# Altium schematic symbol library Linear Technology PMIC-Switching Reg LTC1174-LTC3901.SchLib: 2647 symbols (part 45 of 195) (continued)
## LTC3458LEDE (continued)

## LTC3458LEDE#PBF
designator U?
1.7 A, 1.5 MHz Synchronous Step-Up DC/DC Converter with Output Disconnect, 12-pin SON (DE-UE-12), -40 to 85 degC, Pb-Free; Manufacturer: Linear Technology; PartNumber: LTC3458LEDE#PBF; Number of Outputs: 1; PackageReference: DE-UE-12; PackageDescription: 12-Pin Plastic DFN, Body 4 x 3 mm, Pitch 0.5 mm; Supplier 1: Digi-Key; Supplier Part Number 1: LTC3458LEDE#PBF-ND; RoHS: TRUE; Code_JEDEC: MO-229
footprint LT-DE-UE-12_V (SON, 12-Leads, Body 4x3mm, Pitch 0.5mm, Thermal Pad 3.3x1.7mm)
pins: 1 SW (power) "Switch Pin for Inductor Connection. During discontinuous conduction mode an antiring resistor connects SW to VIN to reduce noise.", 2 VIN (power) "Input Supply Pin. Connect this to the input supply and decouple with 1uF minimum.", 3 SYNC (in) "Oscillator Synchronization Pin. A clock pulse width of 100ns to 2us is required to synchronize the internal oscillator. This pin is disabled when grounded.", 4 ~{SHDN} (in) "Shutdown Pin. Grounding this pin shuts down the IC. Connect to >1.25V to enable.", 5 ILIM (in) "Adjustable Peak Current Limit. Connect a resistor from ILIM to GND to program the peak inductor current according to the following formula: ILIMIT=180/RILIM where ILIMIT is in amps and RILIM is in kohm.", 6 RT "Connect a resistor to ground to program the oscillator frequency, according to the formula:  Fosc = 1/(0.2+0.004 ?RT) where fOSC is in MHz and RT is in kohm. Oscillator frequency can be programmed between 400kHz and (See Datasheet)", 7 FB (in) "Connect Resistor Divider Tap Here. The output voltage can be adjusted from 2V to 6V. Feedback reference voltage is typically 1.225V.", 8 COMP "gm Error Amp Output. A frequency compensation network is connected from this pin to ground to compensate the loop. See the section “Compensating the Feedback Loop?for guidelines.", 9 GND (power) "Signal Ground Pin.", 10 SS (in) "Connect a capacitor between this pin and ground to set soft-start period. 5uA of current is sourced from SS during soft-start.", 11 BURST (in) "Burst Mode Threshold Adjust Pin. A resistor/capacitor combination from this pin to ground programs the average load current at which automatic Burst Mode operation is entered.", 12 VOUT (power) "Output of the Synchronous Rectifier and Internal Gate Drive Source for the Power Switches.", 13 EP (power) "Must be soldered to PCB ground, for electrical contact and optimum thermal performance."

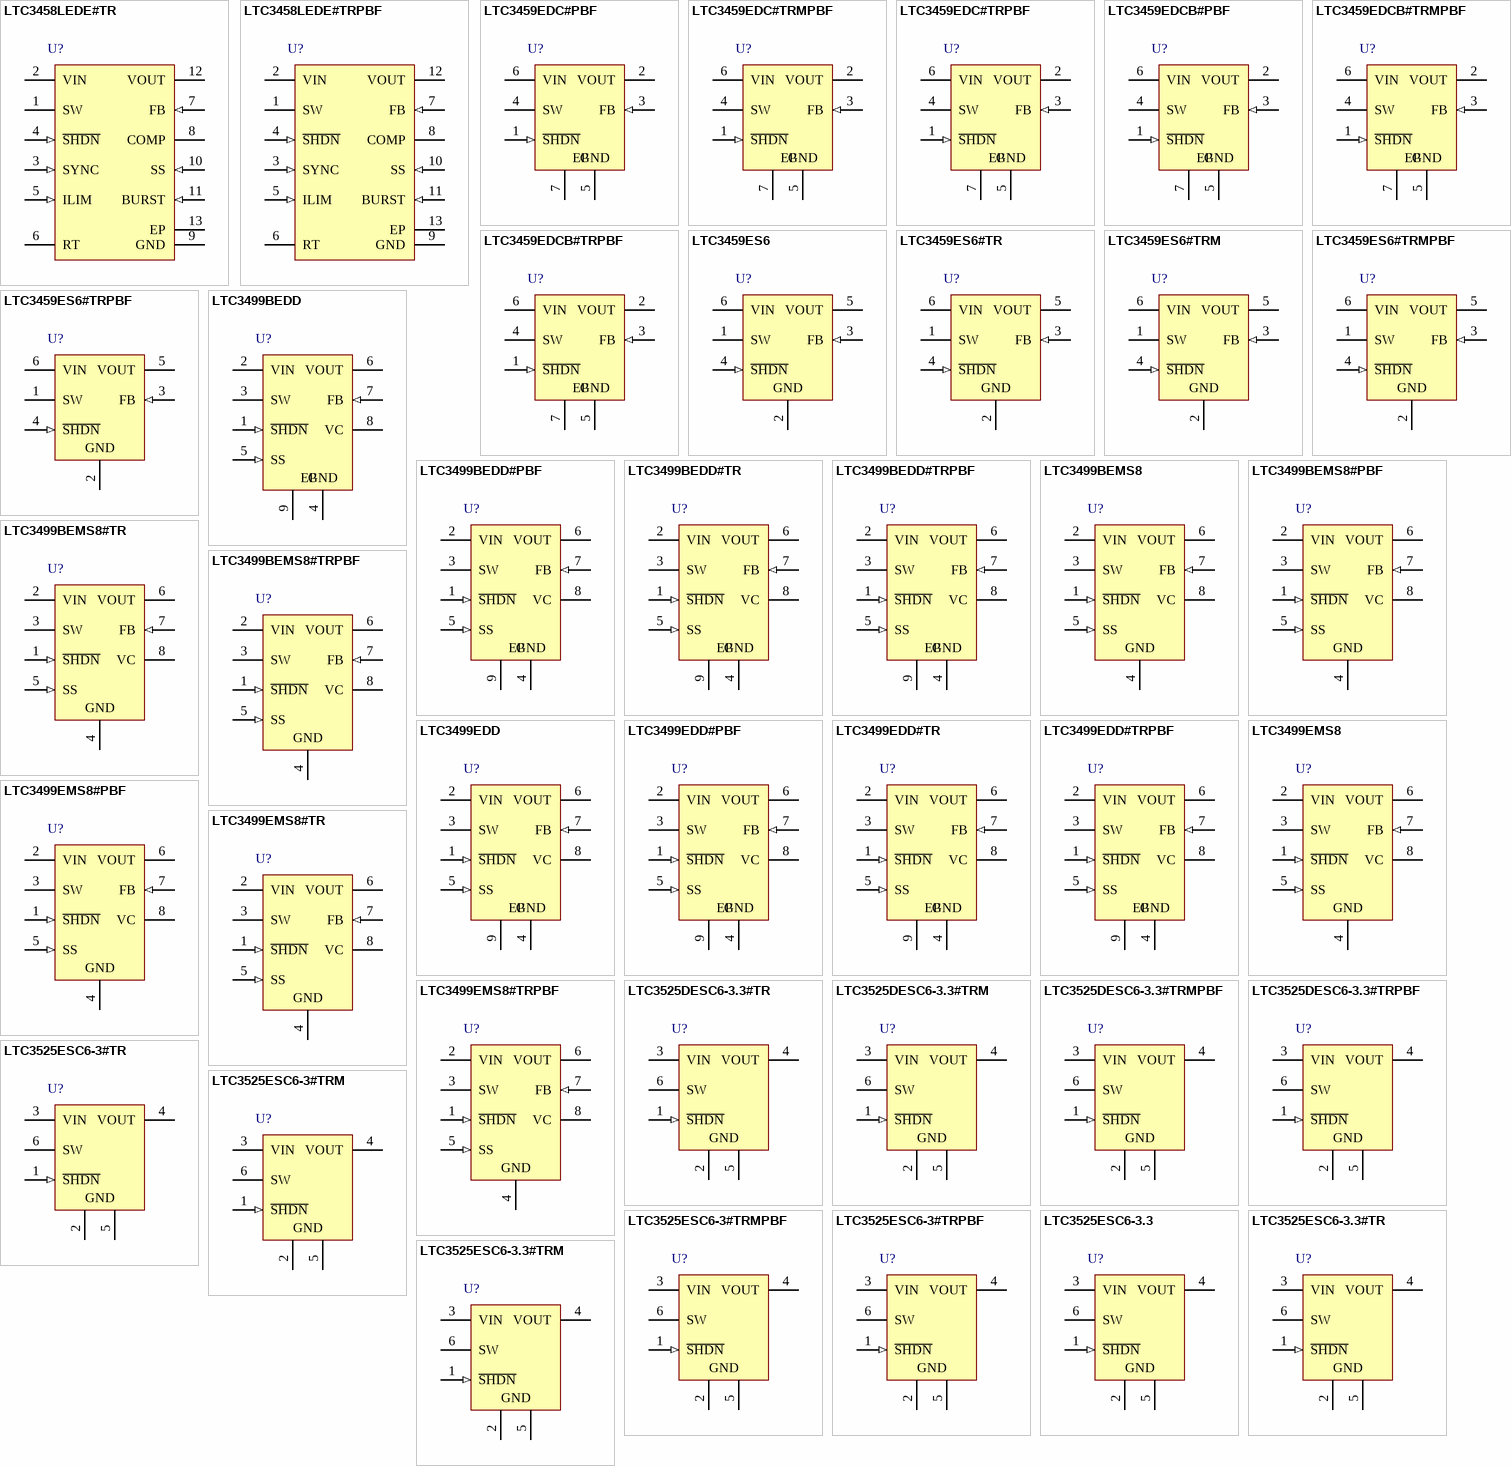
[diagram p28: symbols LTC3458LEDE#TR to LTC3525ESC6-3.3#TRM]

## LTC3458LEDE#TR
designator U?
1.7 A, 1.5 MHz Synchronous Step-Up DC/DC Converter with Output Disconnect, 12-pin SON (DE-UE-12), -40 to 85 degC, Tape and Reel; Manufacturer: Linear Technology; PartNumber: LTC3458LEDE#TR; Number of Outputs: 1; PackageReference: DE-UE-12; PackageDescription: 12-Pin Plastic DFN, Body 4 x 3 mm, Pitch 0.5 mm; RoHS: FALSE; Code_JEDEC: MO-229
footprint LT-DE-UE-12_V (SON, 12-Leads, Body 4x3mm, Pitch 0.5mm, Thermal Pad 3.3x1.7mm)
pins: 1 SW (power) "Switch Pin for Inductor Connection. During discontinuous conduction mode an antiring resistor connects SW to VIN to reduce noise.", 2 VIN (power) "Input Supply Pin. Connect this to the input supply and decouple with 1uF minimum.", 3 SYNC (in) "Oscillator Synchronization Pin. A clock pulse width of 100ns to 2us is required to synchronize the internal oscillator. This pin is disabled when grounded.", 4 ~{SHDN} (in) "Shutdown Pin. Grounding this pin shuts down the IC. Connect to >1.25V to enable.", 5 ILIM (in) "Adjustable Peak Current Limit. Connect a resistor from ILIM to GND to program the peak inductor current according to the following formula: ILIMIT=180/RILIM where ILIMIT is in amps and RILIM is in kohm.", 6 RT "Connect a resistor to ground to program the oscillator frequency, according to the formula:  Fosc = 1/(0.2+0.004 ?RT) where fOSC is in MHz and RT is in kohm. Oscillator frequency can be programmed between 400kHz and (See Datasheet)", 7 FB (in) "Connect Resistor Divider Tap Here. The output voltage can be adjusted from 2V to 6V. Feedback reference voltage is typically 1.225V.", 8 COMP "gm Error Amp Output. A frequency compensation network is connected from this pin to ground to compensate the loop. See the section “Compensating the Feedback Loop?for guidelines.", 9 GND (power) "Signal Ground Pin.", 10 SS (in) "Connect a capacitor between this pin and ground to set soft-start period. 5uA of current is sourced from SS during soft-start.", 11 BURST (in) "Burst Mode Threshold Adjust Pin. A resistor/capacitor combination from this pin to ground programs the average load current at which automatic Burst Mode operation is entered.", 12 VOUT (power) "Output of the Synchronous Rectifier and Internal Gate Drive Source for the Power Switches.", 13 EP (power) "Must be soldered to PCB ground, for electrical contact and optimum thermal performance."

## LTC3458LEDE#TRPBF
designator U?
1.7 A, 1.5 MHz Synchronous Step-Up DC/DC Converter with Output Disconnect, 12-pin SON (DE-UE-12), -40 to 85 degC, Pb-Free, Tape and Reel; Manufacturer: Linear Technology; PartNumber: LTC3458LEDE#TRPBF; Number of Outputs: 1; PackageReference: DE-UE-12; PackageDescription: 12-Pin Plastic DFN, Body 4 x 3 mm, Pitch 0.5 mm; Supplier 1: Digi-Key; Supplier Part Number 1: LTC3458LEDE#TRPBF-ND; RoHS: TRUE; Code_JEDEC: MO-229
footprint LT-DE-UE-12_V (SON, 12-Leads, Body 4x3mm, Pitch 0.5mm, Thermal Pad 3.3x1.7mm)
pins: 1 SW (power) "Switch Pin for Inductor Connection. During discontinuous conduction mode an antiring resistor connects SW to VIN to reduce noise.", 2 VIN (power) "Input Supply Pin. Connect this to the input supply and decouple with 1uF minimum.", 3 SYNC (in) "Oscillator Synchronization Pin. A clock pulse width of 100ns to 2us is required to synchronize the internal oscillator. This pin is disabled when grounded.", 4 ~{SHDN} (in) "Shutdown Pin. Grounding this pin shuts down the IC. Connect to >1.25V to enable.", 5 ILIM (in) "Adjustable Peak Current Limit. Connect a resistor from ILIM to GND to program the peak inductor current according to the following formula: ILIMIT=180/RILIM where ILIMIT is in amps and RILIM is in kohm.", 6 RT "Connect a resistor to ground to program the oscillator frequency, according to the formula:  Fosc = 1/(0.2+0.004 ?RT) where fOSC is in MHz and RT is in kohm. Oscillator frequency can be programmed between 400kHz and (See Datasheet)", 7 FB (in) "Connect Resistor Divider Tap Here. The output voltage can be adjusted from 2V to 6V. Feedback reference voltage is typically 1.225V.", 8 COMP "gm Error Amp Output. A frequency compensation network is connected from this pin to ground to compensate the loop. See the section “Compensating the Feedback Loop?for guidelines.", 9 GND (power) "Signal Ground Pin.", 10 SS (in) "Connect a capacitor between this pin and ground to set soft-start period. 5uA of current is sourced from SS during soft-start.", 11 BURST (in) "Burst Mode Threshold Adjust Pin. A resistor/capacitor combination from this pin to ground programs the average load current at which automatic Burst Mode operation is entered.", 12 VOUT (power) "Output of the Synchronous Rectifier and Internal Gate Drive Source for the Power Switches.", 13 EP (power) "Must be soldered to PCB ground, for electrical contact and optimum thermal performance."

## LTC3459EDC#PBF
designator U?
Micropower Synchronous Boost Converter, 6-pin SON (DC6-6), -40 to 85 degC, Pb-Free; Manufacturer: Linear Technology; PartNumber: LTC3459EDC#PBF; Number of Outputs: 1; PackageReference: DC6-6; PackageDescription: 6-Pin Plastic DFN, Body 2 x 2 mm, Pitch 0.5 mm; Supplier 1: Newark; Supplier Part Number 1: 11R8017; RoHS: TRUE; Code_JEDEC: MO-229
footprint LT-DC6-6_V (SON, 6-Leads, Body 2x2mm, Pitch 0.5mm, Thermal Pad 1.42x0.61mm)
pins: 1 ~{SHDN} (in) "Master Shutdown Input. Driving S\H\D\N\ low disables all IC functions and reduces quiescent current from the battery to less than 1uA. This pin must be pulled above 1V to enable the IC.", 2 VOUT (power) "Regulated Output Voltage of the Boost Regulator. Bypass VOUT with a low ESR, ESL ceramic capacitor between 2.2uF and 10uF. VOUT ripple increases with smaller capacitors.", 3 FB (in) "Input to the Burst Mode Comparator. An external resistor divider connected between VOUT, GND and this pin sets the output voltage to: VOUT = 1.22(1 + R1/R2)", 4 SW "Switch Pin. Connect a 15uH to 33uH inductor between SW and VIN. Keep PCB trace lengths as short and wide as possible to reduce EMI and voltage overshoot. If the inductor current falls to zero, the internal P-channel MOSFET (See Datasheet)", 5 GND (power) "Signal and Power Ground. Provide a short, direct PCB path between GND and the (-) side of the fi lter capacitors on VIN and VOUT.", 6 VIN (power) "Input Supply Pin. Bypass VIN with a low ESR, ESL ceramic capacitor of at least 1uF.", 7 EP (power) "Ground. The Exposed Pad must be soldered to PCB."

## LTC3459EDC#TRMPBF
designator U?
Micropower Synchronous Boost Converter, 6-pin SON (DC6-6), -40 to 85 degC, Pb-Free, Mini Tape and Reel; Manufacturer: Linear Technology; PartNumber: LTC3459EDC#TRMPBF; Number of Outputs: 1; PackageReference: DC6-6; PackageDescription: 6-Pin Plastic DFN, Body 2 x 2 mm, Pitch 0.5 mm; Supplier 1: Digi-Key; Supplier Part Number 1: LTC3459EDC#TRMPBF-ND; RoHS: TRUE; Code_JEDEC: MO-229
footprint LT-DC6-6_V (SON, 6-Leads, Body 2x2mm, Pitch 0.5mm, Thermal Pad 1.42x0.61mm)
pins: 1 ~{SHDN} (in) "Master Shutdown Input. Driving S\H\D\N\ low disables all IC functions and reduces quiescent current from the battery to less than 1uA. This pin must be pulled above 1V to enable the IC.", 2 VOUT (power) "Regulated Output Voltage of the Boost Regulator. Bypass VOUT with a low ESR, ESL ceramic capacitor between 2.2uF and 10uF. VOUT ripple increases with smaller capacitors.", 3 FB (in) "Input to the Burst Mode Comparator. An external resistor divider connected between VOUT, GND and this pin sets the output voltage to: VOUT = 1.22(1 + R1/R2)", 4 SW "Switch Pin. Connect a 15uH to 33uH inductor between SW and VIN. Keep PCB trace lengths as short and wide as possible to reduce EMI and voltage overshoot. If the inductor current falls to zero, the internal P-channel MOSFET (See Datasheet)", 5 GND (power) "Signal and Power Ground. Provide a short, direct PCB path between GND and the (-) side of the fi lter capacitors on VIN and VOUT.", 6 VIN (power) "Input Supply Pin. Bypass VIN with a low ESR, ESL ceramic capacitor of at least 1uF.", 7 EP (power) "Ground. The Exposed Pad must be soldered to PCB."

## LTC3459EDC#TRPBF
designator U?
Micropower Synchronous Boost Converter, 6-pin SON (DC6-6), -40 to 85 degC, Pb-Free, Tape and Reel; Manufacturer: Linear Technology; PartNumber: LTC3459EDC#TRPBF; Number of Outputs: 1; PackageReference: DC6-6; PackageDescription: 6-Pin Plastic DFN, Body 2 x 2 mm, Pitch 0.5 mm; Supplier 1: Digi-Key; Supplier Part Number 1: LTC3459EDC#TRPBF-ND; RoHS: TRUE; Code_JEDEC: MO-229
footprint LT-DC6-6_V (SON, 6-Leads, Body 2x2mm, Pitch 0.5mm, Thermal Pad 1.42x0.61mm)
pins: 1 ~{SHDN} (in) "Master Shutdown Input. Driving S\H\D\N\ low disables all IC functions and reduces quiescent current from the battery to less than 1uA. This pin must be pulled above 1V to enable the IC.", 2 VOUT (power) "Regulated Output Voltage of the Boost Regulator. Bypass VOUT with a low ESR, ESL ceramic capacitor between 2.2uF and 10uF. VOUT ripple increases with smaller capacitors.", 3 FB (in) "Input to the Burst Mode Comparator. An external resistor divider connected between VOUT, GND and this pin sets the output voltage to: VOUT = 1.22(1 + R1/R2)", 4 SW "Switch Pin. Connect a 15uH to 33uH inductor between SW and VIN. Keep PCB trace lengths as short and wide as possible to reduce EMI and voltage overshoot. If the inductor current falls to zero, the internal P-channel MOSFET (See Datasheet)", 5 GND (power) "Signal and Power Ground. Provide a short, direct PCB path between GND and the (-) side of the fi lter capacitors on VIN and VOUT.", 6 VIN (power) "Input Supply Pin. Bypass VIN with a low ESR, ESL ceramic capacitor of at least 1uF.", 7 EP (power) "Ground. The Exposed Pad must be soldered to PCB."

## LTC3459EDCB#PBF
designator U?
Micropower Synchronous Boost Converter, 6-pin SON (DCB-6), -40 to 85 degC, Pb-Free; Manufacturer: Linear Technology; PartNumber: LTC3459EDCB#PBF; Number of Outputs: 1; PackageReference: DCB-6; PackageDescription: 6-Pin Plastic DFN, Body 2 x 3 mm, Pitch 0.5 mm; RoHS: TRUE; Code_JEDEC: MO-229
footprint LT-DCB-6_V (SON, 6-Leads, Body 3x2mm, Pitch 0.5mm, Thermal Pad 1.65x1.35mm)
pins: 1 ~{SHDN} (in) "Master Shutdown Input. Driving S\H\D\N\ low disables all IC functions and reduces quiescent current from the battery to less than 1uA. This pin must be pulled above 1V to enable the IC.", 2 VOUT (power) "Regulated Output Voltage of the Boost Regulator. Bypass VOUT with a low ESR, ESL ceramic capacitor between 2.2uF and 10uF. VOUT ripple increases with smaller capacitors.", 3 FB (in) "Input to the Burst Mode Comparator. An external resistor divider connected between VOUT, GND and this pin sets the output voltage to: VOUT = 1.22(1 + R1/R2)", 4 SW "Switch Pin. Connect a 15uH to 33uH inductor between SW and VIN. Keep PCB trace lengths as short and wide as possible to reduce EMI and voltage overshoot. If the inductor current falls to zero, the internal P-channel MOSFET (See Datasheet)", 5 GND (power) "Signal and Power Ground. Provide a short, direct PCB path between GND and the (-) side of the fi lter capacitors on VIN and VOUT.", 6 VIN (power) "Input Supply Pin. Bypass VIN with a low ESR, ESL ceramic capacitor of at least 1uF.", 7 EP (power) "Ground. The Exposed Pad must be soldered to PCB."

## LTC3459EDCB#TRMPBF
designator U?
Micropower Synchronous Boost Converter, 6-pin SON (DCB-6), -40 to 85 degC, Pb-Free, Mini Tape and Reel; Manufacturer: Linear Technology; PartNumber: LTC3459EDCB#TRMPBF; Number of Outputs: 1; PackageReference: DCB-6; PackageDescription: 6-Pin Plastic DFN, Body 2 x 3 mm, Pitch 0.5 mm; Supplier 1: Digi-Key; Supplier Part Number 1: LTC3459EDCB#TRMPBF-ND; RoHS: TRUE; Code_JEDEC: MO-229
footprint LT-DCB-6_V (SON, 6-Leads, Body 3x2mm, Pitch 0.5mm, Thermal Pad 1.65x1.35mm)
pins: 1 ~{SHDN} (in) "Master Shutdown Input. Driving S\H\D\N\ low disables all IC functions and reduces quiescent current from the battery to less than 1uA. This pin must be pulled above 1V to enable the IC.", 2 VOUT (power) "Regulated Output Voltage of the Boost Regulator. Bypass VOUT with a low ESR, ESL ceramic capacitor between 2.2uF and 10uF. VOUT ripple increases with smaller capacitors.", 3 FB (in) "Input to the Burst Mode Comparator. An external resistor divider connected between VOUT, GND and this pin sets the output voltage to: VOUT = 1.22(1 + R1/R2)", 4 SW "Switch Pin. Connect a 15uH to 33uH inductor between SW and VIN. Keep PCB trace lengths as short and wide as possible to reduce EMI and voltage overshoot. If the inductor current falls to zero, the internal P-channel MOSFET (See Datasheet)", 5 GND (power) "Signal and Power Ground. Provide a short, direct PCB path between GND and the (-) side of the fi lter capacitors on VIN and VOUT.", 6 VIN (power) "Input Supply Pin. Bypass VIN with a low ESR, ESL ceramic capacitor of at least 1uF.", 7 EP (power) "Ground. The Exposed Pad must be soldered to PCB."

## LTC3459EDCB#TRPBF
designator U?
Micropower Synchronous Boost Converter, 6-pin SON (DCB-6), -40 to 85 degC, Pb-Free, Tape and Reel; Manufacturer: Linear Technology; PartNumber: LTC3459EDCB#TRPBF; Number of Outputs: 1; PackageReference: DCB-6; PackageDescription: 6-Pin Plastic DFN, Body 2 x 3 mm, Pitch 0.5 mm; Supplier 1: Digi-Key; Supplier Part Number 1: LTC3459EDCB#TRPBF-ND; RoHS: TRUE; Code_JEDEC: MO-229
footprint LT-DCB-6_V (SON, 6-Leads, Body 3x2mm, Pitch 0.5mm, Thermal Pad 1.65x1.35mm)
pins: 1 ~{SHDN} (in) "Master Shutdown Input. Driving S\H\D\N\ low disables all IC functions and reduces quiescent current from the battery to less than 1uA. This pin must be pulled above 1V to enable the IC.", 2 VOUT (power) "Regulated Output Voltage of the Boost Regulator. Bypass VOUT with a low ESR, ESL ceramic capacitor between 2.2uF and 10uF. VOUT ripple increases with smaller capacitors.", 3 FB (in) "Input to the Burst Mode Comparator. An external resistor divider connected between VOUT, GND and this pin sets the output voltage to: VOUT = 1.22(1 + R1/R2)", 4 SW "Switch Pin. Connect a 15uH to 33uH inductor between SW and VIN. Keep PCB trace lengths as short and wide as possible to reduce EMI and voltage overshoot. If the inductor current falls to zero, the internal P-channel MOSFET (See Datasheet)", 5 GND (power) "Signal and Power Ground. Provide a short, direct PCB path between GND and the (-) side of the fi lter capacitors on VIN and VOUT.", 6 VIN (power) "Input Supply Pin. Bypass VIN with a low ESR, ESL ceramic capacitor of at least 1uF.", 7 EP (power) "Ground. The Exposed Pad must be soldered to PCB."

## LTC3459ES6
designator U?
Micropower Synchronous Boost Converter, 6-pin SOT23 (S6-6), -40 to 85 degC; Manufacturer: Linear Technology; PartNumber: LTC3459ES6; Number of Outputs: 1; PackageReference: S6-6; PackageDescription: 6-Pin Plastic TSOT-23, Body 2.9 x 1.63 mm, Pitch 0.95 mm; RoHS: FALSE; Code_JEDEC: MO-193
footprint LT-S6-6-TSOT-23_N (SOT23, 6-Leads, Body 2.9x1.75mm, Pitch 0.95mm, IPC Medium Density)
footprint LT-S6-6-TSOT-23_L (SOT23, 6-Leads, Body 2.9x1.75mm, Pitch 0.95mm, IPC High Density)
footprint LT-S6-6-TSOT-23_M (SOT23, 6-Leads, Body 2.9x1.75mm, Pitch 0.95mm, IPC Low Density)
pins: 1 SW, 2 GND (power), 3 FB (in), 4 ~{SHDN} (in), 5 VOUT (power), 6 VIN (power)

## LTC3459ES6#TR
designator U?
Micropower Synchronous Boost Converter, 6-pin SOT23 (S6-6), -40 to 85 degC, Tape and Reel; Manufacturer: Linear Technology; PartNumber: LTC3459ES6#TR; Number of Outputs: 1; PackageReference: S6-6; PackageDescription: 6-Pin Plastic TSOT-23, Body 2.9 x 1.63 mm, Pitch 0.95 mm; Supplier 1: Digi-Key; Supplier Part Number 1: LTC3459ES6#TR-ND; RoHS: FALSE; Code_JEDEC: MO-193
footprint LT-S6-6-TSOT-23_N (SOT23, 6-Leads, Body 2.9x1.75mm, Pitch 0.95mm, IPC Medium Density)
footprint LT-S6-6-TSOT-23_L (SOT23, 6-Leads, Body 2.9x1.75mm, Pitch 0.95mm, IPC High Density)
footprint LT-S6-6-TSOT-23_M (SOT23, 6-Leads, Body 2.9x1.75mm, Pitch 0.95mm, IPC Low Density)
pins: 1 SW, 2 GND (power), 3 FB (in), 4 ~{SHDN} (in), 5 VOUT (power), 6 VIN (power)

## LTC3459ES6#TRM
designator U?
Micropower Synchronous Boost Converter, 6-pin SOT23 (S6-6), -40 to 85 degC, Mini Tape and Reel; Manufacturer: Linear Technology; PartNumber: LTC3459ES6#TRM; Number of Outputs: 1; PackageReference: S6-6; PackageDescription: 6-Pin Plastic TSOT-23, Body 2.9 x 1.63 mm, Pitch 0.95 mm; Supplier 1: Digi-Key; Supplier Part Number 1: LTC3459ES6#TRM-ND; RoHS: FALSE; Code_JEDEC: MO-193
footprint LT-S6-6-TSOT-23_N (SOT23, 6-Leads, Body 2.9x1.75mm, Pitch 0.95mm, IPC Medium Density)
footprint LT-S6-6-TSOT-23_L (SOT23, 6-Leads, Body 2.9x1.75mm, Pitch 0.95mm, IPC High Density)
footprint LT-S6-6-TSOT-23_M (SOT23, 6-Leads, Body 2.9x1.75mm, Pitch 0.95mm, IPC Low Density)
pins: 1 SW, 2 GND (power), 3 FB (in), 4 ~{SHDN} (in), 5 VOUT (power), 6 VIN (power)

## LTC3459ES6#TRMPBF
designator U?
Micropower Synchronous Boost Converter, 6-pin SOT23 (S6-6), -40 to 85 degC, Pb-Free, Mini Tape and Reel; Manufacturer: Linear Technology; PartNumber: LTC3459ES6#TRMPBF; Number of Outputs: 1; PackageReference: S6-6; PackageDescription: 6-Pin Plastic TSOT-23, Body 2.9 x 1.63 mm, Pitch 0.95 mm; Supplier 1: Digi-Key; Supplier Part Number 1: LTC3459ES6#TRMPBFTR-ND; RoHS: TRUE; Code_JEDEC: MO-193
footprint LT-S6-6-TSOT-23_N (SOT23, 6-Leads, Body 2.9x1.75mm, Pitch 0.95mm, IPC Medium Density)
footprint LT-S6-6-TSOT-23_L (SOT23, 6-Leads, Body 2.9x1.75mm, Pitch 0.95mm, IPC High Density)
footprint LT-S6-6-TSOT-23_M (SOT23, 6-Leads, Body 2.9x1.75mm, Pitch 0.95mm, IPC Low Density)
pins: 1 SW, 2 GND (power), 3 FB (in), 4 ~{SHDN} (in), 5 VOUT (power), 6 VIN (power)

## LTC3459ES6#TRPBF
designator U?
Micropower Synchronous Boost Converter, 6-pin SOT23 (S6-6), -40 to 85 degC, Pb-Free, Tape and Reel; Manufacturer: Linear Technology; PartNumber: LTC3459ES6#TRPBF; Number of Outputs: 1; PackageReference: S6-6; PackageDescription: 6-Pin Plastic TSOT-23, Body 2.9 x 1.63 mm, Pitch 0.95 mm; Supplier 1: Digi-Key; Supplier Part Number 1: LTC3459ES6#TRPBF-ND; RoHS: TRUE; Code_JEDEC: MO-193
footprint LT-S6-6-TSOT-23_N (SOT23, 6-Leads, Body 2.9x1.75mm, Pitch 0.95mm, IPC Medium Density)
footprint LT-S6-6-TSOT-23_L (SOT23, 6-Leads, Body 2.9x1.75mm, Pitch 0.95mm, IPC High Density)
footprint LT-S6-6-TSOT-23_M (SOT23, 6-Leads, Body 2.9x1.75mm, Pitch 0.95mm, IPC Low Density)
pins: 1 SW, 2 GND (power), 3 FB (in), 4 ~{SHDN} (in), 5 VOUT (power), 6 VIN (power)

## LTC3499BEDD
designator U?
750 mA Synchronous Step-Up DC/DC Converter with Reverse-Battery Protection, 8-pin SON (DD-8), -40 to 85 degC; Manufacturer: Linear Technology; PartNumber: LTC3499BEDD; Number of Outputs: 1; PackageReference: DD-8; PackageDescription: 8-Pin Plastic DFN, Body 3 x 3 mm, Pitch 0.5 mm; RoHS: FALSE; Code_JEDEC: MO-229
footprint LT-DD-8_V (SON, 8-Leads, Body 3x3mm, Pitch 0.5mm, Thermal Pad 1.65x2.38 mm)
pins: 1 ~{SHDN} (in) "Shutdown Input for IC. Connect to a voltage greater than 1.2V to enable and a voltage less than 0.2V to disable the LTC3499/LTC3499B.", 2 VIN (power) "Input Supply Voltage. The valid operating voltage is between 1.8V to 5.5V. VIN has reverse battery protection. Since the LTC3499/LTC3499B use VIN as the main bias source, bypass with a low ESR ceramic capacitor of at least 2.(See Datasheet)", 3 SW "Switch Pin. Connect an inductor from VIN to this pin with a value between 2.2uH and 10uH. Keep PCB trace lengths as short and wide as possible to minimize EMI and voltage overshoot. If the inductor current falls to zero or (See Datasheet)", 4 GND (power) "Signal and Power Ground. The DD package exposed pad must be soldered to the PCB power ground plane for electrical connection and rated thermal performance.", 5 SS (in) "Soft-Start Input. Connect a capacitor from SS to ground to control the inrush current at start-up. An internal 3uA current source charges this pin. SS will be discharged if S\H\D\N\ is pulled low, thermal shutdown occurs or (See Datasheet)", 6 VOUT (power) "Power Supply Output. Connect a low ESR output filter capacitor from this pin to the ground plane.", 7 FB (in) "FB Input to Error Amplifier. Connect a resistor divider tap from VOUT to this pin to set the output voltage. The output voltage can be adjusted between 2V and 6V.", 8 VC "Error Amplifier Output. A frequency compensation network is connected from this pin to GND to compensate the boost converter loop. See Closing the Feedthrough Loop section for guidelines.", 9 EP (power) "Signal and Power Ground. The DD package exposed pad must be soldered to the PCB power ground plane for electrical connection and rated thermal performance."

## LTC3499BEDD#PBF
designator U?
750 mA Synchronous Step-Up DC/DC Converter with Reverse-Battery Protection, 8-pin SON (DD-8), -40 to 85 degC, Pb-Free; Manufacturer: Linear Technology; PartNumber: LTC3499BEDD#PBF; Number of Outputs: 1; PackageReference: DD-8; PackageDescription: 8-Pin Plastic DFN, Body 3 x 3 mm, Pitch 0.5 mm; Supplier 1: Digi-Key; Supplier Part Number 1: LTC3499BEDD#PBF-ND; RoHS: TRUE; Code_JEDEC: MO-229
footprint LT-DD-8_V (SON, 8-Leads, Body 3x3mm, Pitch 0.5mm, Thermal Pad 1.65x2.38 mm)
pins: 1 ~{SHDN} (in) "Shutdown Input for IC. Connect to a voltage greater than 1.2V to enable and a voltage less than 0.2V to disable the LTC3499/LTC3499B.", 2 VIN (power) "Input Supply Voltage. The valid operating voltage is between 1.8V to 5.5V. VIN has reverse battery protection. Since the LTC3499/LTC3499B use VIN as the main bias source, bypass with a low ESR ceramic capacitor of at least 2.(See Datasheet)", 3 SW "Switch Pin. Connect an inductor from VIN to this pin with a value between 2.2uH and 10uH. Keep PCB trace lengths as short and wide as possible to minimize EMI and voltage overshoot. If the inductor current falls to zero or (See Datasheet)", 4 GND (power) "Signal and Power Ground. The DD package exposed pad must be soldered to the PCB power ground plane for electrical connection and rated thermal performance.", 5 SS (in) "Soft-Start Input. Connect a capacitor from SS to ground to control the inrush current at start-up. An internal 3uA current source charges this pin. SS will be discharged if S\H\D\N\ is pulled low, thermal shutdown occurs or (See Datasheet)", 6 VOUT (power) "Power Supply Output. Connect a low ESR output filter capacitor from this pin to the ground plane.", 7 FB (in) "FB Input to Error Amplifier. Connect a resistor divider tap from VOUT to this pin to set the output voltage. The output voltage can be adjusted between 2V and 6V.", 8 VC "Error Amplifier Output. A frequency compensation network is connected from this pin to GND to compensate the boost converter loop. See Closing the Feedthrough Loop section for guidelines.", 9 EP (power) "Signal and Power Ground. The DD package exposed pad must be soldered to the PCB power ground plane for electrical connection and rated thermal performance."

## LTC3499BEDD#TR
designator U?
750 mA Synchronous Step-Up DC/DC Converter with Reverse-Battery Protection, 8-pin SON (DD-8), -40 to 85 degC, Tape and Reel; Manufacturer: Linear Technology; PartNumber: LTC3499BEDD#TR; Number of Outputs: 1; PackageReference: DD-8; PackageDescription: 8-Pin Plastic DFN, Body 3 x 3 mm, Pitch 0.5 mm; RoHS: FALSE; Code_JEDEC: MO-229
footprint LT-DD-8_V (SON, 8-Leads, Body 3x3mm, Pitch 0.5mm, Thermal Pad 1.65x2.38 mm)
pins: 1 ~{SHDN} (in) "Shutdown Input for IC. Connect to a voltage greater than 1.2V to enable and a voltage less than 0.2V to disable the LTC3499/LTC3499B.", 2 VIN (power) "Input Supply Voltage. The valid operating voltage is between 1.8V to 5.5V. VIN has reverse battery protection. Since the LTC3499/LTC3499B use VIN as the main bias source, bypass with a low ESR ceramic capacitor of at least 2.(See Datasheet)", 3 SW "Switch Pin. Connect an inductor from VIN to this pin with a value between 2.2uH and 10uH. Keep PCB trace lengths as short and wide as possible to minimize EMI and voltage overshoot. If the inductor current falls to zero or (See Datasheet)", 4 GND (power) "Signal and Power Ground. The DD package exposed pad must be soldered to the PCB power ground plane for electrical connection and rated thermal performance.", 5 SS (in) "Soft-Start Input. Connect a capacitor from SS to ground to control the inrush current at start-up. An internal 3uA current source charges this pin. SS will be discharged if S\H\D\N\ is pulled low, thermal shutdown occurs or (See Datasheet)", 6 VOUT (power) "Power Supply Output. Connect a low ESR output filter capacitor from this pin to the ground plane.", 7 FB (in) "FB Input to Error Amplifier. Connect a resistor divider tap from VOUT to this pin to set the output voltage. The output voltage can be adjusted between 2V and 6V.", 8 VC "Error Amplifier Output. A frequency compensation network is connected from this pin to GND to compensate the boost converter loop. See Closing the Feedthrough Loop section for guidelines.", 9 EP (power) "Signal and Power Ground. The DD package exposed pad must be soldered to the PCB power ground plane for electrical connection and rated thermal performance."